# Altium footprint library surface.PcbLib: 97 footprints (part 6 of 7)
Each footprint in its own frame and in the unit in brackets; x right, y up, seen from the top. Pads: shape width x height; smd on the part's side, far side on the other; paste and mask are expansions set on the pad; w line width, h text height; cw(c..) or ccw(c..) is an arc to the next point about the centre after c.
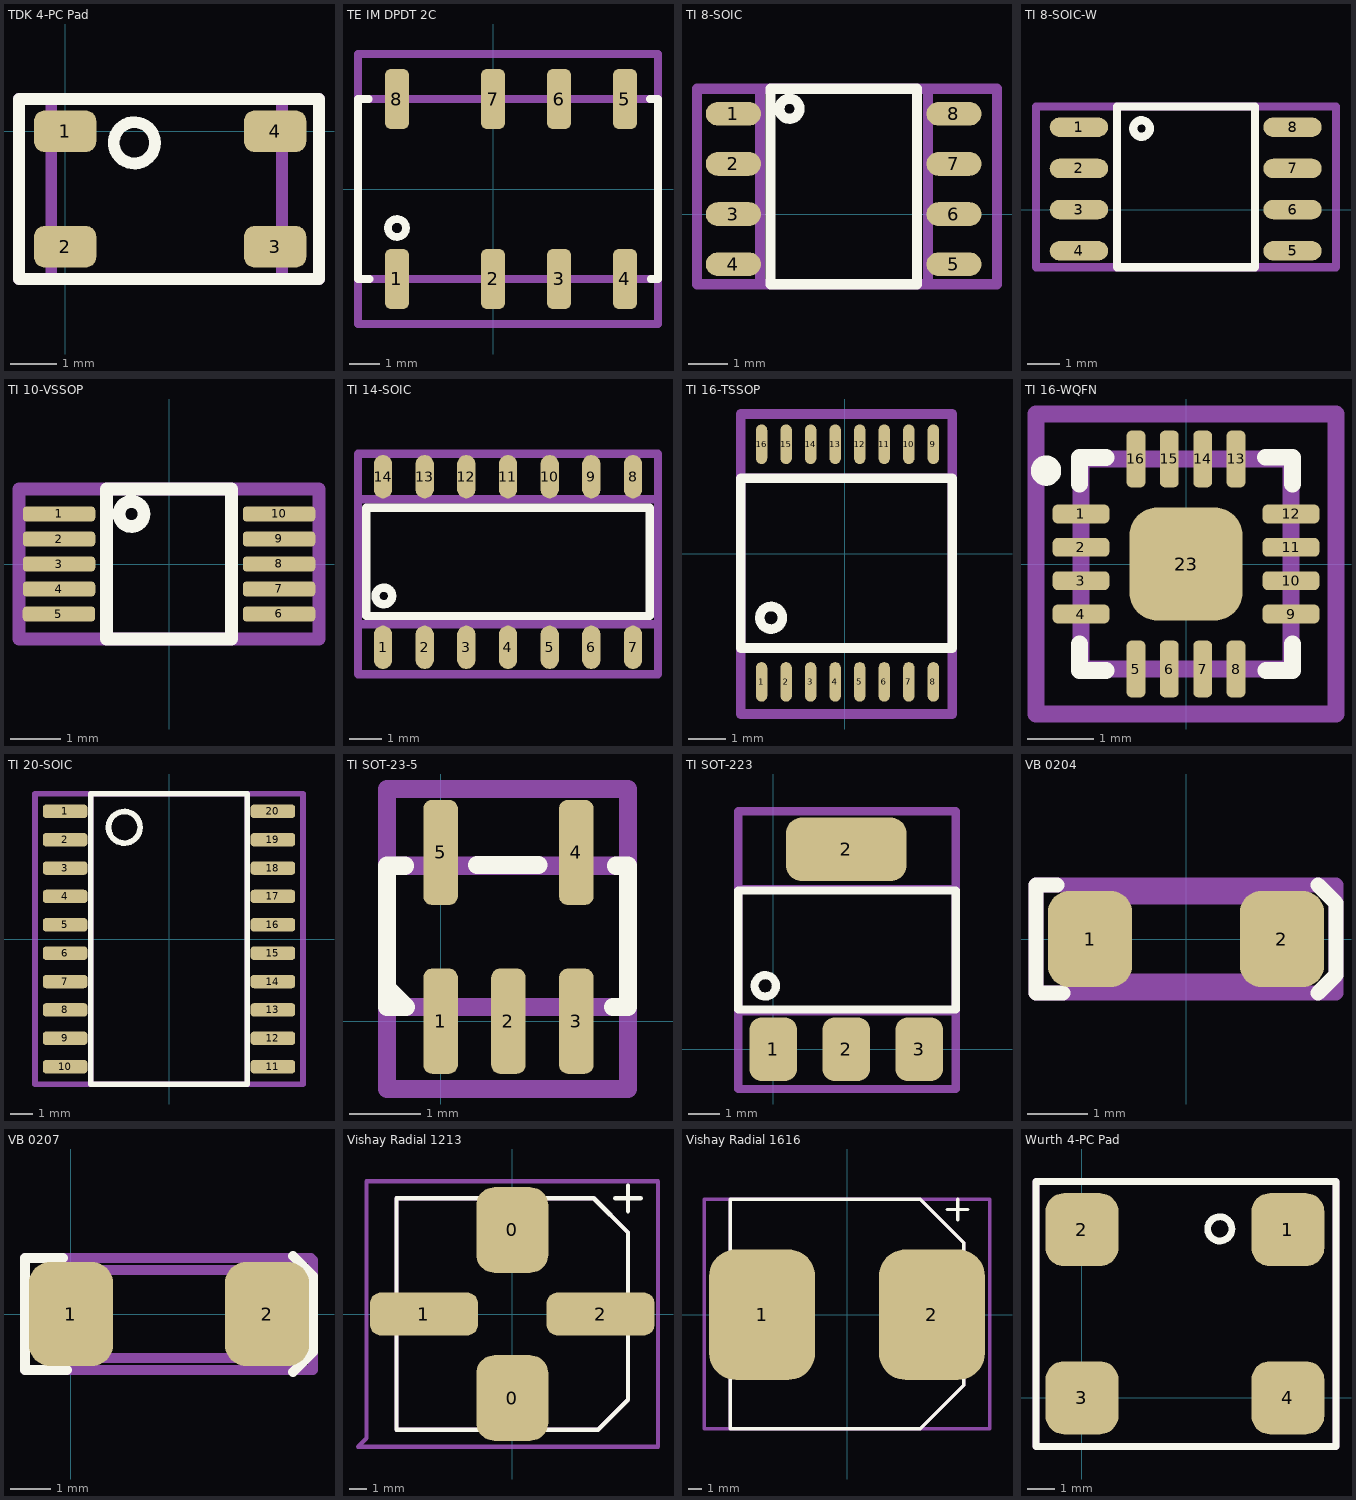
[diagram p5: the footprints below, top view; thin cyan lines are the x and y axes]

## TDK 4-PC Pad [mm]
pads (4):
  rrect50% 1.35x0.9 smd: 1(0,0) 2(0,-2.5) 3(4.55,-2.5) 4(4.55,0)
Top Overlay:
  circle w0.254: c1.5,-0.25 r0.447
  lines w0.254: -1,-3.2 5.5,-3.2 5.5,0.7 -1,0.7 -1,-3.2
Mechanical 13:
  lines w0.254: -0.3,-3.2 4.7,-3.2 4.7,0.7 -0.3,0.7 -0.3,-3.2
Mechanical 15:
  lines w0.254: -1,-3.2 5.5,-3.2 5.5,0.7 -1,0.7 -1,-3.2
3D body "act45b.step": height 2.8, standoff 0, extent -0.023,-2.822 4.477,0.378

## TE IM DPDT 2C [mm]
pads (8):
  rrect50% 0.8x2 smd: 1(-3.2,-3) 2(0,-3) 3(2.2,-3) 4(4.4,-3) 5(4.4,3) 6(2.2,3) 7(0,3) 8(-3.2,3)
Top Overlay:
  circle w0.254: c-3.2,-1.3 r0.3
  lines w0.254: -4.137,3 -4.5,3 -4.5,-3 -4.115,-3 ; 5.235,3 5.5,3 5.5,-3 5.258,-3
Mechanical 13:
  lines w0.254: -4.5,-3 5.5,-3 5.5,3 -4.5,3 -4.5,-3
Mechanical 15:
  lines w0.254: -4.5,-4.5 5.5,-4.5 5.5,4.5 -4.5,4.5 -4.5,-4.5
3D body "c-1462037-2-a-3d.stp": height 5.65, standoff 0, extent -4.5,-3.758 5.5,3.758

## TI 8-SOIC [mm]
pads (8):
  oval 1.4x0.6 smd: 1(-9.677,2.54) 2(-9.677,1.27) 3(-9.677,0) 4(-9.677,-1.27) 5(-4.089,-1.27) 6(-4.089,0) 7(-4.089,1.27) 8(-4.089,2.54)
Top Overlay:
  circle w0.254: c-8.255,2.667 r0.254
  lines w0.254: -8.738,-1.778 -8.738,3.175 -5.029,3.175 -5.029,-1.778 -8.738,-1.778
Mechanical 13:
  lines w0.254: -9,-1.778 -9,3.175 -8.255,3.175 -4.75,3.175 -4.75,-1.778 -9,-1.778
Mechanical 15:
  lines w0.254: -10.6,-1.778 -10.6,3.175 -3,3.175 -3,-1.778 -10.6,-1.778
3D body "D8.step": height 1.76, standoff 0, extent -9.957,-1.867 -3.759,3.137

## TI 8-SOIC-W [mm]
pads (8):
  oval 1.8x0.6 smd: 1(-10.177,2.54) 2(-10.177,1.27) 3(-10.177,0) 4(-10.177,-1.27) 5(-3.589,-1.27) 6(-3.589,0) 7(-3.589,1.27) 8(-3.589,2.54)
Top Overlay:
  circle w0.254: c-8.246,2.5 r0.254
  lines w0.254: -9,-1.778 -4.75,-1.778 -4.75,3.175 -9,3.175 -9,-1.778
Mechanical 13:
  lines w0.254: -9,-1.778 -4.75,-1.778 -4.75,3.175 -8.255,3.175 -9,3.175 -9,-1.778
Mechanical 15:
  lines w0.254: -11.5,-1.778 -2.25,-1.778 -2.25,3.175 -11.5,3.175 -11.5,-1.778
3D body "D8.step": height 1.76, standoff 0, extent -9.957,-1.867 -3.759,3.137

## TI 10-VSSOP [mm]
pads (10):
  rrect50% 1.45x0.3 smd mask+0.05: 1(-2.2,1) 2(-2.2,0.5) 3(-2.2,0) 4(-2.2,-0.5) 5(-2.2,-1) 6(2.2,-1) 7(2.2,-0.5) 8(2.2,0) 9(2.2,0.5) 10(2.2,1)
Top Overlay:
  circle w0.254: c-0.75,1 r0.25
  lines w0.254: -1.25,-1.5 -1.25,1.5 1.25,1.5 1.25,-1.5 -1.25,-1.5
Mechanical 13:
  lines w0.254: -1.25,-1.5 -1.25,1.5 1.25,1.5 1.25,-1.5 -1.25,-1.5
Mechanical 15:
  lines w0.254: -3,-1.5 3,-1.5 3,1.5 -3,1.5 -3,-1.5
3D body "ADS1115IDGSR--3DModel-STEP-56544.STEP": height 1.12, standoff 0.02, extent -2.45,-1.5 2.45,1.5

## TI 14-SOIC [mil]
pads (14):
  oval 22x52 smd: 1(-750,102.36) 2(-700,102.36) 3(-650,102.36) 4(-600,102.36) 5(-550,102.36) 6(-500,102.36) 7(-450,102.36) 8(-450,307.09) 9(-500,307.09) 10(-550,307.09) 11(-600,307.09) 12(-650,307.09) 13(-700,307.09) 14(-750,307.09)
Top Overlay:
  circle w10: c-749,164 r10
  lines w10: -770,140 -770,270 -430,270 -430,140 -770,140
Mechanical 13:
  lines w10: -780,70 -780,334.65 -420,334.65 -420,70 -780,70
Mechanical 15:
  lines w10: -780,130 -780,280 -420,280 -420,130 -780,130
3D body "ts 14-soic.stp": height 68.9, standoff 0, extent -770.28,86.1 -429.73,323.36

## TI 16-TSSOP [mm]
pads (16):
  oval 0.3x1.05 smd: 1(-2.2,-3.4) 2(-1.55,-3.4) 3(-0.9,-3.4) 4(-0.25,-3.4) 5(0.4,-3.4) 6(1.05,-3.4) 7(1.7,-3.4) 8(2.35,-3.4) 9(2.35,2.9) 10(1.7,2.9) 11(1.05,2.9) 12(0.4,2.9) 13(-0.25,2.9) 14(-0.9,2.9) 15(-1.55,2.9) 16(-2.2,2.9)
Top Overlay:
  circle w0.254: c-1.95,-1.7 r0.3
  lines w0.254: -2.75,-2.5 2.85,-2.5 2.85,2 -2.75,2 -2.75,-2.5
Mechanical 13:
  lines w0.254: -2.75,-2.5 2.85,-2.5 2.85,2 -2.75,2 -2.75,-2.5
Mechanical 15:
  lines w0.254: -2.75,-4.25 -2.75,3.7 2.85,3.7 2.85,-4.25 -2.75,-4.25
3D body "TI 16-TSSOP.step": height 1.2, standoff 0, extent -2.494,-3.552 2.612,3.052

## TI 16-WQFN [mm]
pads (17):
  rrect50% 0.85x0.28 smd: 1(-1.575,0.75) 2(-1.575,0.25) 3(-1.575,-0.25) 4(-1.575,-0.75) 9(1.575,-0.75) 10(1.575,-0.25) 11(1.575,0.25) 12(1.575,0.75)
  rrect50% 0.28x0.85 smd: 5(-0.75,-1.575) 6(-0.25,-1.575) 7(0.25,-1.575) 8(0.75,-1.575) 13(0.75,1.575) 14(0.25,1.575) 15(-0.25,1.575) 16(-0.75,1.575)
  rrect50% 1.7x1.7 smd: 23(0,0)
Top Overlay:
  circle w0.254: c-2.1,1.4 r0.1
  lines w0.254: -1.6,-1.2 -1.6,-1.6 -1.2,-1.6 ; -1.6,1.2 -1.6,1.6 -1.2,1.6 ; 1.195,1.601 1.595,1.601 1.595,1.201 ; 1.2,-1.6 1.6,-1.6 1.6,-1.2
Mechanical 13:
  lines w0.254: -1.575,-1.575 1.575,-1.575 1.575,1.575 -1.575,1.575 -1.575,-1.575
Mechanical 15:
  lines w0.254: -2.25,-2.25 -2.25,2.25 2.25,2.25 2.25,-2.25 -2.25,-2.25
3D body: height 0.8, standoff 0, extent -1.575,-1.575 1.575,1.575

## TI 20-SOIC [mm]
pads (20):
  rrect50% 2x0.6 smd: 1(-4.65,5.715) 2(-4.65,4.445) 3(-4.65,3.175) 4(-4.65,1.905) 5(-4.65,0.635) 6(-4.65,-0.635) 7(-4.65,-1.905) 8(-4.65,-3.175) 9(-4.65,-4.445) 10(-4.65,-5.715) 11(4.65,-5.715) 12(4.65,-4.445) 13(4.65,-3.175) 14(4.65,-1.905) 15(4.65,-0.635) 16(4.65,0.635) 17(4.65,1.905) 18(4.65,3.175) 19(4.65,4.445) 20(4.65,5.715)
Top Overlay:
  circle w0.254: c-2,5 r0.707
  lines w0.254: -3.5,-6.5 3.5,-6.5 3.5,6.502 -3.5,6.502 -3.5,-6.5
Mechanical 13:
  lines w0.254: -3.5,-6.5 3.5,-6.5 3.5,6.5 -3.5,6.5 -3.5,-6.5
Mechanical 15:
  lines w0.254: -6,-6.5 6,-6.5 6,6.5 -6,6.5 -6,-6.5
3D body "DW20.step": height 2.64, standoff 0, extent -5.321,-6.502 5.321,6.502

## TI SOT-23-5 [mil]
pads (5):
  rrect50% 19x58 smd: 1(0,0) 2(37.4,0) 3(74.8,0) 4(74.8,93) 5(0,93)
Top Overlay:
  lines w10: -29,17.75 -19.13,7.87 -29.53,7.87 -29.53,85.63 -19.63,85.63 ; 20,86 54,86 ; 95.13,7.87 103.35,7.87 103.35,85.63 96.63,85.63
Mechanical 13:
  lines w10: -29.53,-37.4 -29.53,127.95 103.35,127.95 103.35,-37.4 -29.53,-37.4
Mechanical 15:
  lines w10: -29.53,7.87 103.35,7.87 103.35,85.63 -29.53,85.63 -29.53,7.87
3D body "DBV5.step": height 57.09, standoff 0, extent -22.6,-11.76 97.4,106.27

## TI SOT-223 [mm]
pads (4):
  rrect50% 1.5x2 smd: 1(0,0) 2(2.3,0) 3(4.6,0)
  rrect50% 3.8x2 smd: 2(2.3,6.3)
Top Overlay:
  circle w0.254: c-0.25,2 r0.335
  lines w0.254: -1.1,1.25 -1.1,5 5.75,5 5.75,1.25 -1.1,1.25
Mechanical 13:
  lines w0.254: -1.1,-1.25 -1.1,7.5 5.75,7.5 5.75,-1.25 -1.1,-1.25
Mechanical 15:
  lines w0.254: -1.1,1.2 5.75,1.2 5.75,5.05 -1.1,5.05 -1.1,4.3 -1.1,1.2
3D body "SOT223-3.step": height 1.6, standoff 0, extent -0.925,-0.437 5.575,6.637

## VB 0204 [mm]
pads (2):
  rrect50% 1.4x1.6 smd: 1(-1.6,0) 2(1.6,0)
Top Overlay:
  lines w0.254: -2.15,0.9 -2.5,0.9 -2.5,-0.9 -2.05,-0.9 ; 2.2,-0.9 2.5,-0.6 2.5,0.6 2.2,0.9
Mechanical 13:
  lines w0.254: -1.8,-0.7 1.8,-0.7 1.8,0.7 -1.8,0.7 -1.8,-0.7
Mechanical 15:
  lines w0.254: -2.5,-0.9 -2.5,0.9 2.5,0.9 2.5,-0.9 -2.5,-0.9
3D body "MMA 0204.stp": height 1.4, standoff 0, extent -1.8,-0.7 1.8,0.7

## VB 0207 [mm]
pads (2):
  rrect50% 2.1x2.6 smd: 1(0,0) 2(4.9,0)
Top Overlay:
  lines w0.254: -0.2,1.4 -1.15,1.4 -1.15,-1.4 -0.1,-1.4 ; 5.55,-1.45 6.05,-0.95 6.05,0.95 5.55,1.45
Mechanical 13:
  lines w0.254: -0.45,-1.1 -0.45,1.1 5.35,1.1 5.35,-1.1 -0.45,-1.1
Mechanical 15:
  lines w0.254: -1.15,-1.4 6.05,-1.4 6.05,1.35 6,1.4 -1.15,1.4 -1.15,0.8 -1.15,-1.4
3D body "RESMELF-0207.stp": height 2.19, standoff 0, extent -0.45,-1.098 5.35,1.098

## Vishay Radial 1213 [mm]
pads (4):
  rrect50% 4.2x5 smd: 0(0,-4.9) 0(0,4.9)
  rrect50% 6.3x2.5 smd: 1(-5.15,0) 2(5.15,0)
Top Overlay:
  lines w0.254: 6,6.75 7.5,6.75 ; 6.75,6 6.75,7.5 ; -6.75,-6.75 5,-6.75 6.75,-5 6.75,3 6.75,4.75 4.75,6.75 -6.75,6.75 -6.75,-6.75
Mechanical 13:
  lines w0.254: -6.75,-6.75 -6.75,6.75 4.75,6.75 6.75,4.75 6.75,-5 5,-6.75 -6.75,-6.75
Mechanical 15:
  lines w0.254: -9,-7.75 -8.5,-7.25 -8.5,7.75 8.5,7.75 8.5,-7.75 -9,-7.75
3D body "vishay 1213.STEP": height 14.31, standoff 0, extent -7.45,-6.45 7.45,6.45

## Vishay Radial 1616 [mm]
pads (2):
  rrect50% 7.8x9.6 smd: 1(-6.25,0) 2(6.25,0)
Top Overlay:
  lines w0.254: 7.4,7.75 8.9,7.75 ; 8.15,7 8.15,8.5 ; -8.6,-8.4 -8.6,8.5 5.4,8.5 6.75,7.15 8.6,5.3 8.6,-5.2 5.4,-8.4 -8.6,-8.4
Mechanical 13:
  lines w0.254: -8.6,-8.4 5.4,-8.4 8.6,-5.2 8.6,5.3 5.4,8.5 -8.6,8.5 -8.6,-8.4
Mechanical 15:
  lines w0.254: -10.5,-8.4 10.5,-8.4 10.5,8.5 -10.5,8.5 -10.5,-8.4
3D body "vishay 1616.STEP": height 16.61, standoff -0.3, extent -9.3,-8.2 9.3,8.4

## Wurth 4-PC Pad [mm]
pads (4):
  rrect50% 2.7x2.7 smd: 1(7.62,6.22) 2(0,6.22) 3(0,0) 4(7.62,0)
Top Overlay:
  circle w0.254: c5.1,6.25 r0.447
  lines w0.254: -1.7,-1.8 -1.7,8 9.4,8 9.4,-1.8 -1.7,-1.8
Mechanical 13:
  lines w0.254: -1.7,-1.8 9.4,-1.8 9.4,8 -1.7,8 -1.7,-1.8
Mechanical 15:
  lines w0.254: -1.7,-1.8 -1.7,8 9.4,8 9.4,-1.8 -1.7,-1.8
3D body "744272121 (rev1).stp": height 6.2, standoff 0.2, extent -1.19,-1.24 8.81,7.46